# Altium footprint library CHIP.PcbLib: 86 footprints (part 4 of 6)
Each footprint in its own frame and in the unit in brackets; x right, y up, seen from the top. Pads: shape width x height; smd on the part's side, far side on the other; paste and mask are expansions set on the pad; w line width, h text height; cw(c..) or ccw(c..) is an arc to the next point about the centre after c.
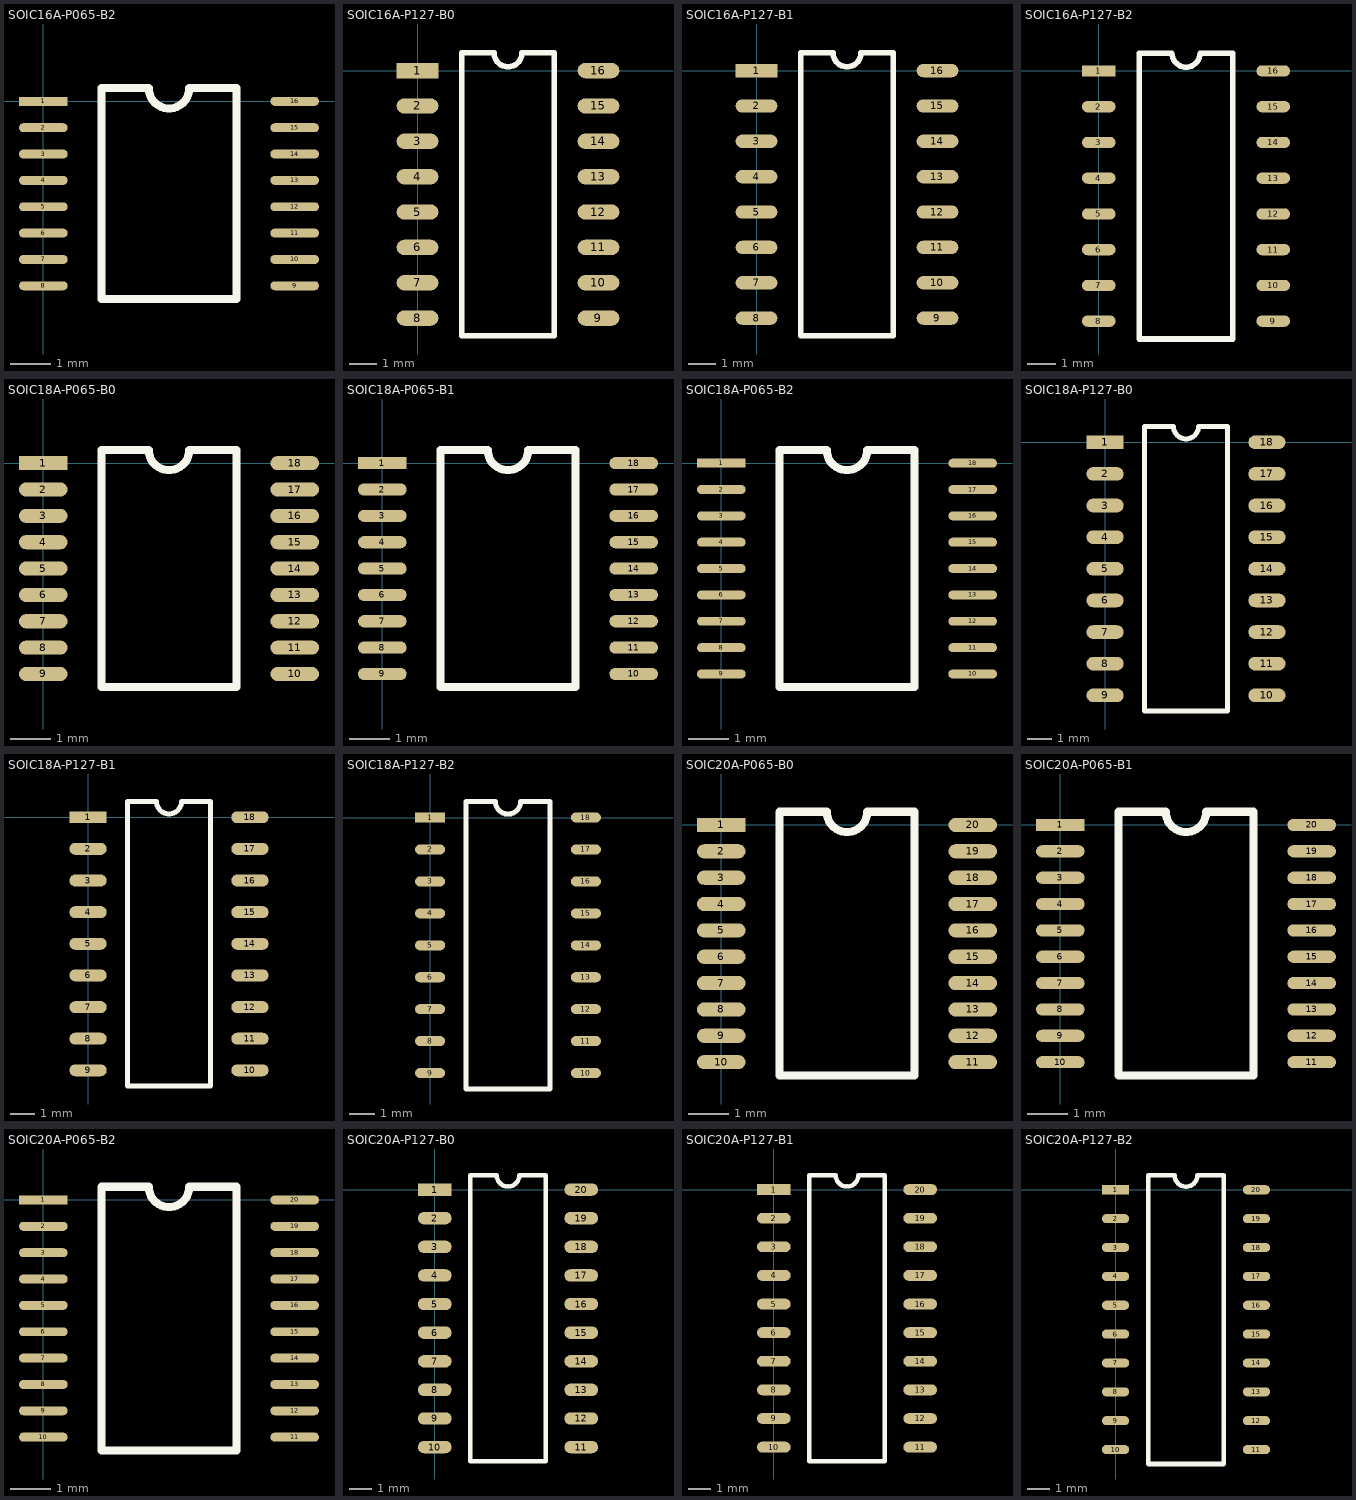
[diagram p3: the footprints below, top view; thin cyan lines are the x and y axes]

## SOIC16A-P065-B2 [mm]
pads (16):
  rect 1.2x0.22 smd: 1(0,0)
  oval 1.2x0.22 smd: 2(0,-0.65) 3(0,-1.3) 4(0,-1.95) 5(0,-2.6) 6(0,-3.25) 7(0,-3.9) 8(0,-4.55) 9(6.2,-4.55) 10(6.2,-3.9) 11(6.2,-3.25) 12(6.2,-2.6) 13(6.2,-1.95) 14(6.2,-1.3) 15(6.2,-0.65) 16(6.2,0)
Top Overlay:
  lines w0.2: 1.435,-4.875 4.765,-4.875 4.765,0.325 3.6,0.325 cw(c3.1,0.325) 2.6,0.325 1.435,0.325 1.435,-4.875

## SOIC16A-P127-B0 [mm]
pads (16):
  rect 1.5x0.55 smd: 1(0,0)
  oval 1.5x0.55 smd: 2(0,-1.27) 3(0,-2.54) 4(0,-3.81) 5(0,-5.08) 6(0,-6.35) 7(0,-7.62) 8(0,-8.89) 9(6.5,-8.89) 10(6.5,-7.62) 11(6.5,-6.35) 12(6.5,-5.08) 13(6.5,-3.81) 14(6.5,-2.54) 15(6.5,-1.27) 16(6.5,0)
Top Overlay:
  lines w0.2: 1.585,-9.525 4.915,-9.525 4.915,0.635 3.75,0.635 cw(c3.25,0.635) 2.75,0.635 1.585,0.635 1.585,-9.525

## SOIC16A-P127-B1 [mm]
pads (16):
  rect 1.5x0.48 smd: 1(0,0)
  oval 1.5x0.48 smd: 2(0,-1.27) 3(0,-2.54) 4(0,-3.81) 5(0,-5.08) 6(0,-6.35) 7(0,-7.62) 8(0,-8.89) 9(6.5,-8.89) 10(6.5,-7.62) 11(6.5,-6.35) 12(6.5,-5.08) 13(6.5,-3.81) 14(6.5,-2.54) 15(6.5,-1.27) 16(6.5,0)
Top Overlay:
  lines w0.2: 1.585,-9.525 4.915,-9.525 4.915,0.635 3.75,0.635 cw(c3.25,0.635) 2.75,0.635 1.585,0.635 1.585,-9.525

## SOIC16A-P127-B2 [mm]
pads (16):
  rect 1.2x0.4 smd: 1(0,0)
  oval 1.2x0.4 smd: 2(0,-1.27) 3(0,-2.54) 4(0,-3.81) 5(0,-5.08) 6(0,-6.35) 7(0,-7.62) 8(0,-8.89) 9(6.2,-8.89) 10(6.2,-7.62) 11(6.2,-6.35) 12(6.2,-5.08) 13(6.2,-3.81) 14(6.2,-2.54) 15(6.2,-1.27) 16(6.2,0)
Top Overlay:
  lines w0.2: 1.435,-9.525 1.435,0.635 2.6,0.635 ccw(c3.1,0.635) 3.6,0.635 4.765,0.635 4.765,-9.525 1.435,-9.525

## SOIC18A-P065-B0 [mm]
pads (18):
  rect 1.2x0.35 smd: 1(0,0)
  oval 1.2x0.35 smd: 2(0,-0.65) 3(0,-1.3) 4(0,-1.95) 5(0,-2.6) 6(0,-3.25) 7(0,-3.9) 8(0,-4.55) 9(0,-5.2) 10(6.2,-5.2) 11(6.2,-4.55) 12(6.2,-3.9) 13(6.2,-3.25) 14(6.2,-2.6) 15(6.2,-1.95) 16(6.2,-1.3) 17(6.2,-0.65) 18(6.2,0)
Top Overlay:
  lines w0.2: 1.435,-5.525 1.435,0.325 2.6,0.325 ccw(c3.1,0.325) 3.6,0.325 4.765,0.325 4.765,-5.525 1.435,-5.525

## SOIC18A-P065-B1 [mm]
pads (18):
  rect 1.2x0.3 smd: 1(0,0)
  oval 1.2x0.3 smd: 2(0,-0.65) 3(0,-1.3) 4(0,-1.95) 5(0,-2.6) 6(0,-3.25) 7(0,-3.9) 8(0,-4.55) 9(0,-5.2) 10(6.2,-5.2) 11(6.2,-4.55) 12(6.2,-3.9) 13(6.2,-3.25) 14(6.2,-2.6) 15(6.2,-1.95) 16(6.2,-1.3) 17(6.2,-0.65) 18(6.2,0)
Top Overlay:
  lines w0.2: 1.435,-5.525 1.435,0.325 2.6,0.325 ccw(c3.1,0.325) 3.6,0.325 4.765,0.325 4.765,-5.525 1.435,-5.525

## SOIC18A-P065-B2 [mm]
pads (18):
  rect 1.2x0.22 smd: 1(0,0)
  oval 1.2x0.22 smd: 2(0,-0.65) 3(0,-1.3) 4(0,-1.95) 5(0,-2.6) 6(0,-3.25) 7(0,-3.9) 8(0,-4.55) 9(0,-5.2) 10(6.2,-5.2) 11(6.2,-4.55) 12(6.2,-3.9) 13(6.2,-3.25) 14(6.2,-2.6) 15(6.2,-1.95) 16(6.2,-1.3) 17(6.2,-0.65) 18(6.2,0)
Top Overlay:
  lines w0.2: 1.435,-5.525 1.435,0.325 2.6,0.325 ccw(c3.1,0.325) 3.6,0.325 4.765,0.325 4.765,-5.525 1.435,-5.525

## SOIC18A-P127-B0 [mm]
pads (18):
  rect 1.5x0.55 smd: 1(0,0)
  oval 1.5x0.55 smd: 2(0,-1.27) 3(0,-2.54) 4(0,-3.81) 5(0,-5.08) 6(0,-6.35) 7(0,-7.62) 8(0,-8.89) 9(0,-10.16) 10(6.5,-10.16) 11(6.5,-8.89) 12(6.5,-7.62) 13(6.5,-6.35) 14(6.5,-5.08) 15(6.5,-3.81) 16(6.5,-2.54) 17(6.5,-1.27) 18(6.5,0)
Top Overlay:
  lines w0.2: 1.585,-10.795 4.915,-10.795 4.915,0.635 3.75,0.635 cw(c3.25,0.635) 2.75,0.635 1.585,0.635 1.585,-10.795

## SOIC18A-P127-B1 [mm]
pads (18):
  rect 1.5x0.48 smd: 1(0,0)
  oval 1.5x0.48 smd: 2(0,-1.27) 3(0,-2.54) 4(0,-3.81) 5(0,-5.08) 6(0,-6.35) 7(0,-7.62) 8(0,-8.89) 9(0,-10.16) 10(6.5,-10.16) 11(6.5,-8.89) 12(6.5,-7.62) 13(6.5,-6.35) 14(6.5,-5.08) 15(6.5,-3.81) 16(6.5,-2.54) 17(6.5,-1.27) 18(6.5,0)
Top Overlay:
  lines w0.2: 1.585,-10.795 1.585,0.635 2.75,0.635 ccw(c3.25,0.635) 3.75,0.635 4.915,0.635 4.915,-10.795 1.585,-10.795

## SOIC18A-P127-B2 [mm]
pads (18):
  rect 1.2x0.4 smd: 1(0,0)
  oval 1.2x0.4 smd: 2(0,-1.27) 3(0,-2.54) 4(0,-3.81) 5(0,-5.08) 6(0,-6.35) 7(0,-7.62) 8(0,-8.89) 9(0,-10.16) 10(6.2,-10.16) 11(6.2,-8.89) 12(6.2,-7.62) 13(6.2,-6.35) 14(6.2,-5.08) 15(6.2,-3.81) 16(6.2,-2.54) 17(6.2,-1.27) 18(6.2,0)
Top Overlay:
  lines w0.2: 1.435,-10.795 1.435,0.635 2.6,0.635 ccw(c3.1,0.635) 3.6,0.635 4.765,0.635 4.765,-10.795 1.435,-10.795

## SOIC20A-P065-B0 [mm]
pads (20):
  rect 1.2x0.35 smd: 1(0,0)
  oval 1.2x0.35 smd: 2(0,-0.65) 3(0,-1.3) 4(0,-1.95) 5(0,-2.6) 6(0,-3.25) 7(0,-3.9) 8(0,-4.55) 9(0,-5.2) 10(0,-5.85) 11(6.2,-5.85) 12(6.2,-5.2) 13(6.2,-4.55) 14(6.2,-3.9) 15(6.2,-3.25) 16(6.2,-2.6) 17(6.2,-1.95) 18(6.2,-1.3) 19(6.2,-0.65) 20(6.2,0)
Top Overlay:
  lines w0.2: 1.435,-6.175 1.435,0.325 2.6,0.325 ccw(c3.1,0.325) 3.6,0.325 4.765,0.325 4.765,-6.175 1.435,-6.175

## SOIC20A-P065-B1 [mm]
pads (20):
  rect 1.2x0.3 smd: 1(0,0)
  oval 1.2x0.3 smd: 2(0,-0.65) 3(0,-1.3) 4(0,-1.95) 5(0,-2.6) 6(0,-3.25) 7(0,-3.9) 8(0,-4.55) 9(0,-5.2) 10(0,-5.85) 11(6.2,-5.85) 12(6.2,-5.2) 13(6.2,-4.55) 14(6.2,-3.9) 15(6.2,-3.25) 16(6.2,-2.6) 17(6.2,-1.95) 18(6.2,-1.3) 19(6.2,-0.65) 20(6.2,0)
Top Overlay:
  lines w0.2: 1.435,-6.175 4.765,-6.175 4.765,0.325 3.6,0.325 cw(c3.1,0.325) 2.6,0.325 1.435,0.325 1.435,-6.175

## SOIC20A-P065-B2 [mm]
pads (20):
  rect 1.2x0.22 smd: 1(0,0)
  oval 1.2x0.22 smd: 2(0,-0.65) 3(0,-1.3) 4(0,-1.95) 5(0,-2.6) 6(0,-3.25) 7(0,-3.9) 8(0,-4.55) 9(0,-5.2) 10(0,-5.85) 11(6.2,-5.85) 12(6.2,-5.2) 13(6.2,-4.55) 14(6.2,-3.9) 15(6.2,-3.25) 16(6.2,-2.6) 17(6.2,-1.95) 18(6.2,-1.3) 19(6.2,-0.65) 20(6.2,0)
Top Overlay:
  lines w0.2: 1.435,-6.175 1.435,0.325 2.6,0.325 ccw(c3.1,0.325) 3.6,0.325 4.765,0.325 4.765,-6.175 1.435,-6.175

## SOIC20A-P127-B0 [mm]
pads (20):
  rect 1.5x0.55 smd: 1(0,0)
  oval 1.5x0.55 smd: 2(0,-1.27) 3(0,-2.54) 4(0,-3.81) 5(0,-5.08) 6(0,-6.35) 7(0,-7.62) 8(0,-8.89) 9(0,-10.16) 10(0,-11.43) 11(6.5,-11.43) 12(6.5,-10.16) 13(6.5,-8.89) 14(6.5,-7.62) 15(6.5,-6.35) 16(6.5,-5.08) 17(6.5,-3.81) 18(6.5,-2.54) 19(6.5,-1.27) 20(6.5,0)
Top Overlay:
  lines w0.2: 1.585,-12.065 4.915,-12.065 4.915,0.635 3.75,0.635 cw(c3.25,0.635) 2.75,0.635 1.585,0.635 1.585,-12.065

## SOIC20A-P127-B1 [mm]
pads (20):
  rect 1.5x0.48 smd: 1(0,0)
  oval 1.5x0.48 smd: 2(0,-1.27) 3(0,-2.54) 4(0,-3.81) 5(0,-5.08) 6(0,-6.35) 7(0,-7.62) 8(0,-8.89) 9(0,-10.16) 10(0,-11.43) 11(6.5,-11.43) 12(6.5,-10.16) 13(6.5,-8.89) 14(6.5,-7.62) 15(6.5,-6.35) 16(6.5,-5.08) 17(6.5,-3.81) 18(6.5,-2.54) 19(6.5,-1.27) 20(6.5,0)
Top Overlay:
  lines w0.2: 1.585,-12.065 1.585,0.635 2.75,0.635 ccw(c3.25,0.635) 3.75,0.635 4.915,0.635 4.915,-12.065 1.585,-12.065

## SOIC20A-P127-B2 [mm]
pads (20):
  rect 1.2x0.4 smd: 1(0,0)
  oval 1.2x0.4 smd: 2(0,-1.27) 3(0,-2.54) 4(0,-3.81) 5(0,-5.08) 6(0,-6.35) 7(0,-7.62) 8(0,-8.89) 9(0,-10.16) 10(0,-11.43) 11(6.2,-11.43) 12(6.2,-10.16) 13(6.2,-8.89) 14(6.2,-7.62) 15(6.2,-6.35) 16(6.2,-5.08) 17(6.2,-3.81) 18(6.2,-2.54) 19(6.2,-1.27) 20(6.2,0)
Top Overlay:
  lines w0.2: 1.435,-12.065 4.765,-12.065 4.765,0.635 3.6,0.635 cw(c3.1,0.635) 2.6,0.635 1.435,0.635 1.435,-12.065